# Altium schematic symbol library TI Amplifiers and Linear Special Function Amplifier.SchLib: 708 symbols (part 12 of 34)
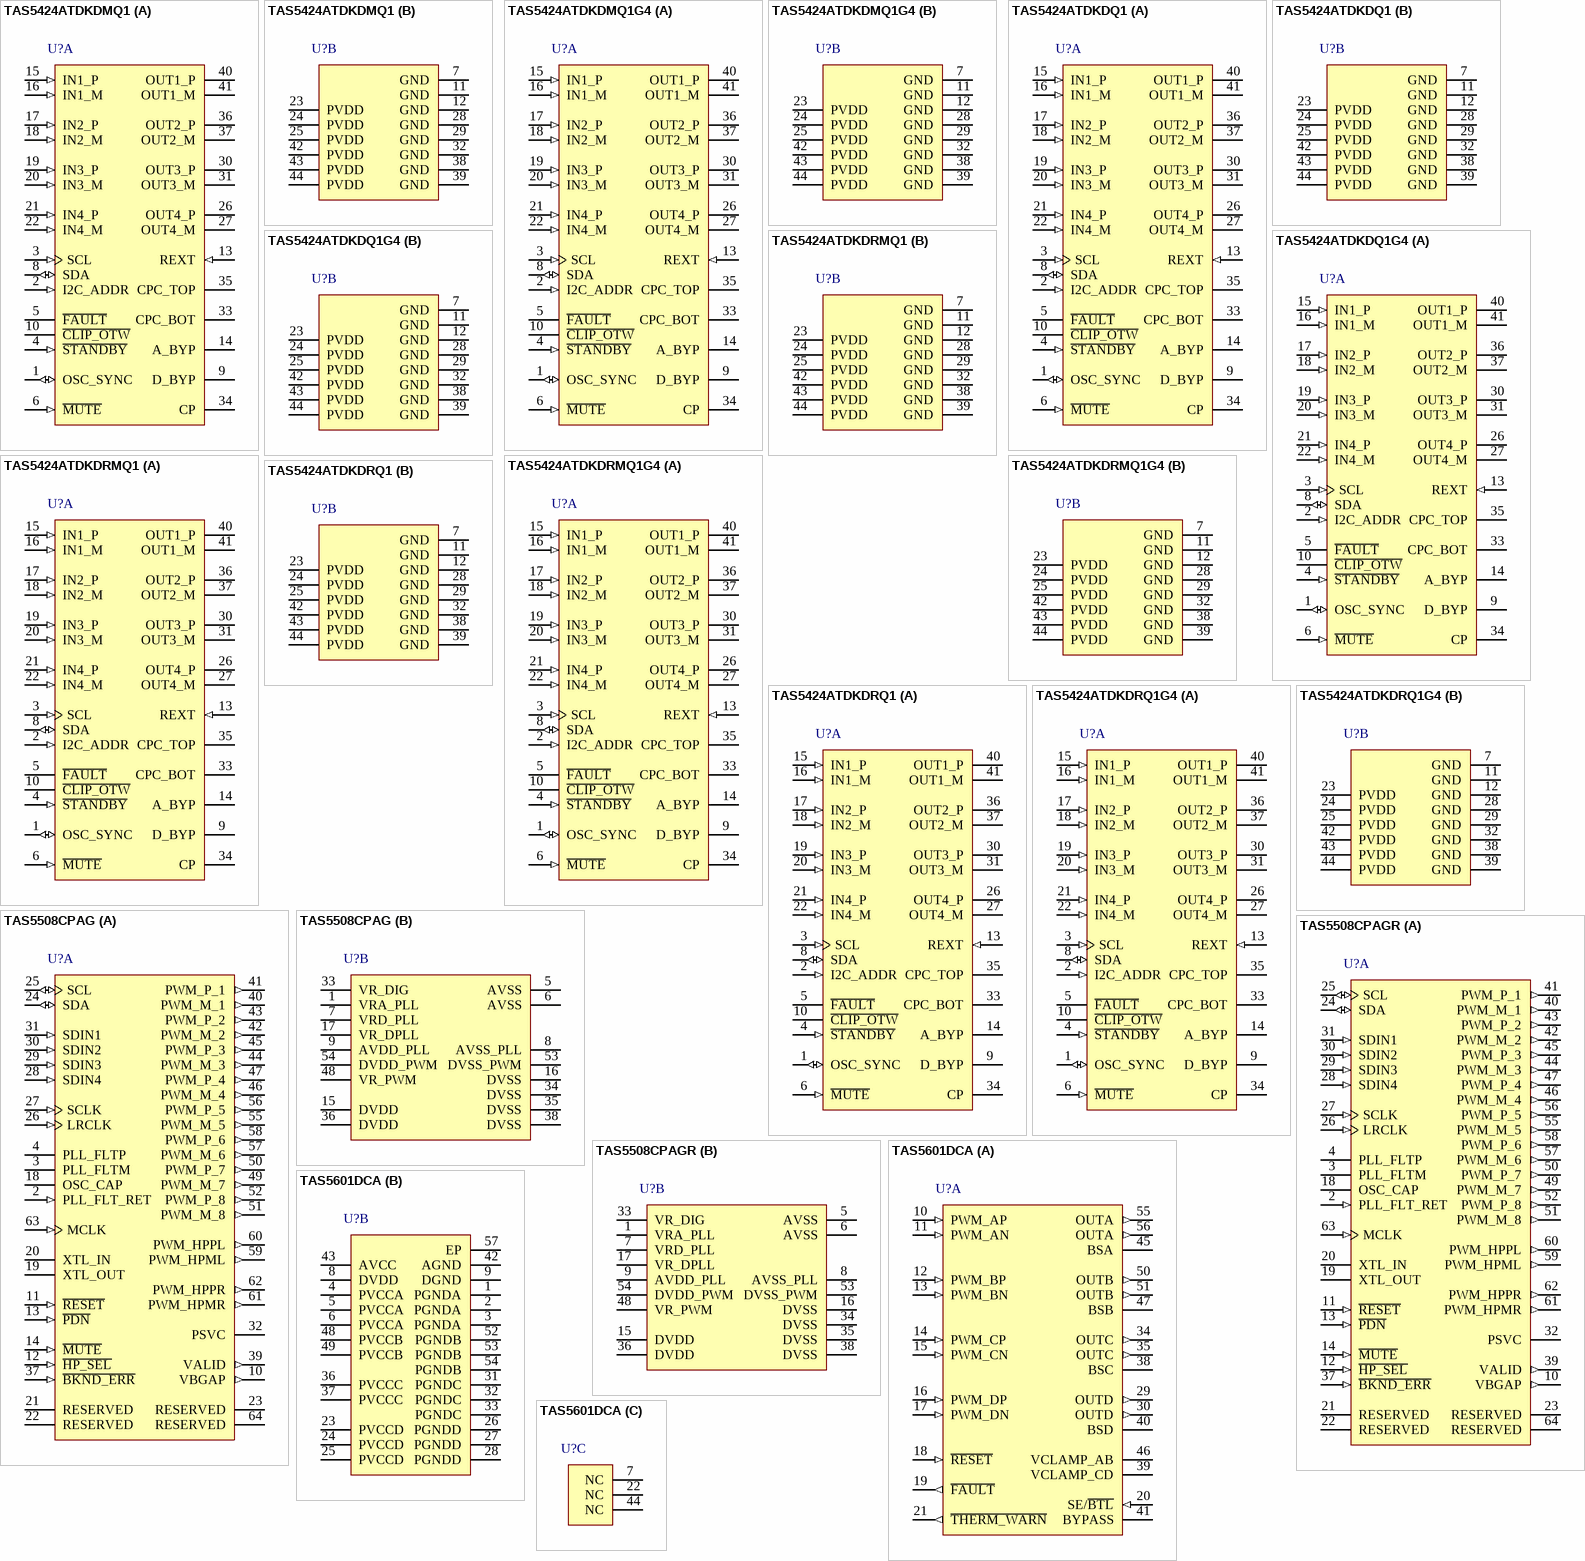
[diagram p50: symbols TAS5424ATDKDMQ1 to TAS5601DCA]

## TAS5424ATDKDMQ1G4
designator U?
4-Channel Automotive Digital Amplifier, -40 to 105 degC, 44-pin SOP (DKD44), Green (RoHS & no Sb/Br); Manufacturer: Texas Instruments; PartNumber: TAS5424ATDKDMQ1G4; Analog Supply Max [V]: 26.5; Analog Supply Min [V]: 6; Input Type: Analog; Max. Number of Speaker Outputs: 4; SubFamily: Mid/High-Power Amplifier; DatasheetVersion: SLOS535C; PackageVersion: 4204421-3/K, 06/2012; PackageReference: DKD44; PackageDescription: 44-Pin Plastic Small Outline, Body 11 x 15.9 mm, Pitch 0.65 mm; Supplier 1: Digi-Key; Supplier Part Number 1: TAS5424ATDKDMQ1G4-ND; Supplier 2: Mouser; Supplier Part Number 2: 595-TA5424ATDKDMQ1G4; Eco-Plan: Green (RoHS & no Sb/Br); Power Stage Supply Min(V): 6; Mounting Technology: Surface Mount; ComponentLink1Description: Manufacturer URL; ComponentLink1URL: http://www.ti.com/; ComponentLink2Description: Datasheet; ComponentLink2URL: http://www.ti.com/general/docs/lit/getliterature.tsp?genericPartNumber=TAS5424A&fileType=pdf; ComponentLink3Description: Package Specification; ComponentLink3URL: http://www.ti.com/litv/pdf/mpdi001b
footprint TI-DKD44_N (SOP, 44-Leads, Body 15.9x11mm, Pitch 0.65mm, IPC Medium Density)
footprint TI-DKD44_L (SOP, 44-Leads, Body 15.9x11mm, Pitch 0.65mm, IPC High Density)
footprint TI-DKD44_M (SOP, 44-Leads, Body 15.9x11mm, Pitch 0.65mm, IPC Low Density)
part A pins: 1 OSC_SYNC (io) "Oscillator sync input from master or output to slave amplifiers (20 MHz divided by 5, 6, or 7)", 2 I2C_ADDR (in) "I2C address bit", 3 SCL (in) "I2C clock input from system I2C master", 4 ~{STANDBY} (in) "Active-low STANDBY pin. Standby (low), power up (high)", 5 ~{FAULT} (oc) "Global fault output (open drain): UV, OV, OTSD, OCSD, DC", 6 ~{MUTE} (in) "Gain ramp control: mute (low), play (high)", 8 SDA (io) "I2C data I/O for communication with system I2C master", 9 D_BYP "Bypass pin for DVDD regulator output", 10 ~{CLIP_OTW} (oc) "Open-drain CLIP, OTW, or logical OR of the CLIP and OTW outputs. It also reports tweeter detection during tweeter mode.", 13 REXT (in) "Precision resistor pin to set analog reference", 14 A_BYP "Bypass pin for the AVDD analog regulator", 15 IN1_P (in) "Non-inverting analog input for channel 1", 16 IN1_M (in) "Inverting analog input for channel 1 (TAS5424A only)", 17 IN2_P (in) "Non-inverting analog input for channel 2", 18 IN2_M (in) "Inverting analog input for channel 2 (TAS5424A only)", 19 IN3_P (in) "Non-inverting analog input for channel 3", 20 IN3_M (in) "Inverting analog input for channel 3 (TAS5424A only)", 21 IN4_P (in) "Non-inverting analog input for channel 4", 22 IN4_M (in) "Inverting analog input for channel 4 (TAS5424A only)", 26 OUT4_P (hiz) "+ polarity output for bridge 4", 27 OUT4_M (hiz) "- polarity output for bridge 4", 30 OUT3_P (hiz) "+ polarity output for bridge 3", 31 OUT3_M (hiz) "- polarity output for bridge 3", 33 CPC_BOT "Bottom of flying capacitor for charge pump", 34 CP "Top of main storage capacitor for charge pump (bottom goes to PVDD)", 35 CPC_TOP "Top of flying capacitor for charge pump", 36 OUT2_P (hiz) "+ polarity output for bridge 2", 37 OUT2_M (hiz) "- polarity output for bridge 2", 40 OUT1_P (hiz) "+ polarity output for bridge 1", 41 OUT1_M (hiz) "- polarity output for bridge 1"
part B pins: 7 GND (power) "Ground", 11 GND (power) "Ground", 12 GND (power) "Ground", 23 PVDD (power) "PVDD supply", 24 PVDD (power) "PVDD supply", 25 PVDD (power) "PVDD supply", 28 GND (power) "Ground", 29 GND (power) "Ground", 32 GND (power) "Ground", 38 GND (power) "Ground", 39 GND (power) "Ground", 42 PVDD (power) "PVDD supply", 43 PVDD (power) "PVDD supply", 44 PVDD (power) "PVDD supply"

## TAS5424ATDKDQ1
designator U?
4-Channel Automotive Digital Amplifier, -40 to 105 degC, 44-pin SOP (DKD44), Green (RoHS & no Sb/Br); Manufacturer: Texas Instruments; PartNumber: TAS5424ATDKDQ1; Analog Supply Max [V]: 26.5; Analog Supply Min [V]: 6; Input Type: Analog; Max. Number of Speaker Outputs: 4; SubFamily: Mid/High-Power Amplifier; DatasheetVersion: SLOS535C; PackageVersion: 4204421-3/K, 06/2012; PackageReference: DKD44; PackageDescription: 44-Pin Plastic Small Outline, Body 11 x 15.9 mm, Pitch 0.65 mm; Supplier 1: Digi-Key; Supplier Part Number 1: TAS5424ATDKDQ1-ND; Supplier 2: Newark; Supplier Part Number 2: 54M7298; Supplier 3: Mouser; Supplier Part Number 3: 595-TAS5424ATDKDQ1; Eco-Plan: Green (RoHS & no Sb/Br); Power Stage Supply Min(V): 6; Mounting Technology: Surface Mount; ComponentLink1Description: Manufacturer URL; ComponentLink1URL: http://www.ti.com/; ComponentLink2Description: Datasheet; ComponentLink2URL: http://www.ti.com/general/docs/lit/getliterature.tsp?genericPartNumber=TAS5424A&fileType=pdf; ComponentLink3Description: Package Specification; ComponentLink3URL: http://www.ti.com/litv/pdf/mpdi001b
footprint TI-DKD44_N (SOP, 44-Leads, Body 15.9x11mm, Pitch 0.65mm, IPC Medium Density)
footprint TI-DKD44_L (SOP, 44-Leads, Body 15.9x11mm, Pitch 0.65mm, IPC High Density)
footprint TI-DKD44_M (SOP, 44-Leads, Body 15.9x11mm, Pitch 0.65mm, IPC Low Density)
part A pins: 1 OSC_SYNC (io) "Oscillator sync input from master or output to slave amplifiers (20 MHz divided by 5, 6, or 7)", 2 I2C_ADDR (in) "I2C address bit", 3 SCL (in) "I2C clock input from system I2C master", 4 ~{STANDBY} (in) "Active-low STANDBY pin. Standby (low), power up (high)", 5 ~{FAULT} (oc) "Global fault output (open drain): UV, OV, OTSD, OCSD, DC", 6 ~{MUTE} (in) "Gain ramp control: mute (low), play (high)", 8 SDA (io) "I2C data I/O for communication with system I2C master", 9 D_BYP "Bypass pin for DVDD regulator output", 10 ~{CLIP_OTW} (oc) "Open-drain CLIP, OTW, or logical OR of the CLIP and OTW outputs. It also reports tweeter detection during tweeter mode.", 13 REXT (in) "Precision resistor pin to set analog reference", 14 A_BYP "Bypass pin for the AVDD analog regulator", 15 IN1_P (in) "Non-inverting analog input for channel 1", 16 IN1_M (in) "Inverting analog input for channel 1 (TAS5424A only)", 17 IN2_P (in) "Non-inverting analog input for channel 2", 18 IN2_M (in) "Inverting analog input for channel 2 (TAS5424A only)", 19 IN3_P (in) "Non-inverting analog input for channel 3", 20 IN3_M (in) "Inverting analog input for channel 3 (TAS5424A only)", 21 IN4_P (in) "Non-inverting analog input for channel 4", 22 IN4_M (in) "Inverting analog input for channel 4 (TAS5424A only)", 26 OUT4_P (hiz) "+ polarity output for bridge 4", 27 OUT4_M (hiz) "- polarity output for bridge 4", 30 OUT3_P (hiz) "+ polarity output for bridge 3", 31 OUT3_M (hiz) "- polarity output for bridge 3", 33 CPC_BOT "Bottom of flying capacitor for charge pump", 34 CP "Top of main storage capacitor for charge pump (bottom goes to PVDD)", 35 CPC_TOP "Top of flying capacitor for charge pump", 36 OUT2_P (hiz) "+ polarity output for bridge 2", 37 OUT2_M (hiz) "- polarity output for bridge 2", 40 OUT1_P (hiz) "+ polarity output for bridge 1", 41 OUT1_M (hiz) "- polarity output for bridge 1"
part B pins: 7 GND (power) "Ground", 11 GND (power) "Ground", 12 GND (power) "Ground", 23 PVDD (power) "PVDD supply", 24 PVDD (power) "PVDD supply", 25 PVDD (power) "PVDD supply", 28 GND (power) "Ground", 29 GND (power) "Ground", 32 GND (power) "Ground", 38 GND (power) "Ground", 39 GND (power) "Ground", 42 PVDD (power) "PVDD supply", 43 PVDD (power) "PVDD supply", 44 PVDD (power) "PVDD supply"

## TAS5424ATDKDQ1G4
designator U?
4-Channel Automotive Digital Amplifier, -40 to 105 degC, 44-pin SOP (DKD44), Green (RoHS & no Sb/Br); Manufacturer: Texas Instruments; PartNumber: TAS5424ATDKDQ1G4; Analog Supply Max [V]: 26.5; Analog Supply Min [V]: 6; Input Type: Analog; Max. Number of Speaker Outputs: 4; SubFamily: Mid/High-Power Amplifier; DatasheetVersion: SLOS535C; PackageVersion: 4204421-3/K, 06/2012; PackageReference: DKD44; PackageDescription: 44-Pin Plastic Small Outline, Body 11 x 15.9 mm, Pitch 0.65 mm; Supplier 1: Digi-Key; Supplier Part Number 1: TAS5424ATDKDQ1G4-ND; Supplier 2: Mouser; Supplier Part Number 2: 595-TAS5424ATDKDQ1G4; Eco-Plan: Green (RoHS & no Sb/Br); Power Stage Supply Min(V): 6; Mounting Technology: Surface Mount; ComponentLink1Description: Manufacturer URL; ComponentLink1URL: http://www.ti.com/; ComponentLink2Description: Datasheet; ComponentLink2URL: http://www.ti.com/general/docs/lit/getliterature.tsp?genericPartNumber=TAS5424A&fileType=pdf; ComponentLink3Description: Package Specification; ComponentLink3URL: http://www.ti.com/litv/pdf/mpdi001b
footprint TI-DKD44_N (SOP, 44-Leads, Body 15.9x11mm, Pitch 0.65mm, IPC Medium Density)
footprint TI-DKD44_L (SOP, 44-Leads, Body 15.9x11mm, Pitch 0.65mm, IPC High Density)
footprint TI-DKD44_M (SOP, 44-Leads, Body 15.9x11mm, Pitch 0.65mm, IPC Low Density)
part A pins: 1 OSC_SYNC (io) "Oscillator sync input from master or output to slave amplifiers (20 MHz divided by 5, 6, or 7)", 2 I2C_ADDR (in) "I2C address bit", 3 SCL (in) "I2C clock input from system I2C master", 4 ~{STANDBY} (in) "Active-low STANDBY pin. Standby (low), power up (high)", 5 ~{FAULT} (oc) "Global fault output (open drain): UV, OV, OTSD, OCSD, DC", 6 ~{MUTE} (in) "Gain ramp control: mute (low), play (high)", 8 SDA (io) "I2C data I/O for communication with system I2C master", 9 D_BYP "Bypass pin for DVDD regulator output", 10 ~{CLIP_OTW} (oc) "Open-drain CLIP, OTW, or logical OR of the CLIP and OTW outputs. It also reports tweeter detection during tweeter mode.", 13 REXT (in) "Precision resistor pin to set analog reference", 14 A_BYP "Bypass pin for the AVDD analog regulator", 15 IN1_P (in) "Non-inverting analog input for channel 1", 16 IN1_M (in) "Inverting analog input for channel 1 (TAS5424A only)", 17 IN2_P (in) "Non-inverting analog input for channel 2", 18 IN2_M (in) "Inverting analog input for channel 2 (TAS5424A only)", 19 IN3_P (in) "Non-inverting analog input for channel 3", 20 IN3_M (in) "Inverting analog input for channel 3 (TAS5424A only)", 21 IN4_P (in) "Non-inverting analog input for channel 4", 22 IN4_M (in) "Inverting analog input for channel 4 (TAS5424A only)", 26 OUT4_P (hiz) "+ polarity output for bridge 4", 27 OUT4_M (hiz) "- polarity output for bridge 4", 30 OUT3_P (hiz) "+ polarity output for bridge 3", 31 OUT3_M (hiz) "- polarity output for bridge 3", 33 CPC_BOT "Bottom of flying capacitor for charge pump", 34 CP "Top of main storage capacitor for charge pump (bottom goes to PVDD)", 35 CPC_TOP "Top of flying capacitor for charge pump", 36 OUT2_P (hiz) "+ polarity output for bridge 2", 37 OUT2_M (hiz) "- polarity output for bridge 2", 40 OUT1_P (hiz) "+ polarity output for bridge 1", 41 OUT1_M (hiz) "- polarity output for bridge 1"
part B pins: 7 GND (power) "Ground", 11 GND (power) "Ground", 12 GND (power) "Ground", 23 PVDD (power) "PVDD supply", 24 PVDD (power) "PVDD supply", 25 PVDD (power) "PVDD supply", 28 GND (power) "Ground", 29 GND (power) "Ground", 32 GND (power) "Ground", 38 GND (power) "Ground", 39 GND (power) "Ground", 42 PVDD (power) "PVDD supply", 43 PVDD (power) "PVDD supply", 44 PVDD (power) "PVDD supply"

## TAS5424ATDKDRMQ1
designator U?
4-Channel Automotive Digital Amplifier, -40 to 105 degC, 44-pin SOP (DKD44), Green (RoHS & no Sb/Br); Manufacturer: Texas Instruments; PartNumber: TAS5424ATDKDRMQ1; Analog Supply Max [V]: 26.5; Analog Supply Min [V]: 6; Input Type: Analog; Max. Number of Speaker Outputs: 4; SubFamily: Mid/High-Power Amplifier; DatasheetVersion: SLOS535C; PackageVersion: 4204421-3/K, 06/2012; PackageReference: DKD44; PackageDescription: 44-Pin Plastic Small Outline, Body 11 x 15.9 mm, Pitch 0.65 mm; Supplier 1: Digi-Key; Supplier Part Number 1: TAS5424ATDKDRMQ1-ND; Supplier 2: Mouser; Supplier Part Number 2: 595-TAS5424ATDKDRMQ1; Eco-Plan: Green (RoHS & no Sb/Br); Power Stage Supply Min(V): 6; Mounting Technology: Surface Mount; ComponentLink1Description: Manufacturer URL; ComponentLink1URL: http://www.ti.com/; ComponentLink2Description: Datasheet; ComponentLink2URL: http://www.ti.com/general/docs/lit/getliterature.tsp?genericPartNumber=TAS5424A&fileType=pdf; ComponentLink3Description: Package Specification; ComponentLink3URL: http://www.ti.com/litv/pdf/mpdi001b
footprint TI-DKD44_N (SOP, 44-Leads, Body 15.9x11mm, Pitch 0.65mm, IPC Medium Density)
footprint TI-DKD44_L (SOP, 44-Leads, Body 15.9x11mm, Pitch 0.65mm, IPC High Density)
footprint TI-DKD44_M (SOP, 44-Leads, Body 15.9x11mm, Pitch 0.65mm, IPC Low Density)
part A pins: 1 OSC_SYNC (io) "Oscillator sync input from master or output to slave amplifiers (20 MHz divided by 5, 6, or 7)", 2 I2C_ADDR (in) "I2C address bit", 3 SCL (in) "I2C clock input from system I2C master", 4 ~{STANDBY} (in) "Active-low STANDBY pin. Standby (low), power up (high)", 5 ~{FAULT} (oc) "Global fault output (open drain): UV, OV, OTSD, OCSD, DC", 6 ~{MUTE} (in) "Gain ramp control: mute (low), play (high)", 8 SDA (io) "I2C data I/O for communication with system I2C master", 9 D_BYP "Bypass pin for DVDD regulator output", 10 ~{CLIP_OTW} (oc) "Open-drain CLIP, OTW, or logical OR of the CLIP and OTW outputs. It also reports tweeter detection during tweeter mode.", 13 REXT (in) "Precision resistor pin to set analog reference", 14 A_BYP "Bypass pin for the AVDD analog regulator", 15 IN1_P (in) "Non-inverting analog input for channel 1", 16 IN1_M (in) "Inverting analog input for channel 1 (TAS5424A only)", 17 IN2_P (in) "Non-inverting analog input for channel 2", 18 IN2_M (in) "Inverting analog input for channel 2 (TAS5424A only)", 19 IN3_P (in) "Non-inverting analog input for channel 3", 20 IN3_M (in) "Inverting analog input for channel 3 (TAS5424A only)", 21 IN4_P (in) "Non-inverting analog input for channel 4", 22 IN4_M (in) "Inverting analog input for channel 4 (TAS5424A only)", 26 OUT4_P (hiz) "+ polarity output for bridge 4", 27 OUT4_M (hiz) "- polarity output for bridge 4", 30 OUT3_P (hiz) "+ polarity output for bridge 3", 31 OUT3_M (hiz) "- polarity output for bridge 3", 33 CPC_BOT "Bottom of flying capacitor for charge pump", 34 CP "Top of main storage capacitor for charge pump (bottom goes to PVDD)", 35 CPC_TOP "Top of flying capacitor for charge pump", 36 OUT2_P (hiz) "+ polarity output for bridge 2", 37 OUT2_M (hiz) "- polarity output for bridge 2", 40 OUT1_P (hiz) "+ polarity output for bridge 1", 41 OUT1_M (hiz) "- polarity output for bridge 1"
part B pins: 7 GND (power) "Ground", 11 GND (power) "Ground", 12 GND (power) "Ground", 23 PVDD (power) "PVDD supply", 24 PVDD (power) "PVDD supply", 25 PVDD (power) "PVDD supply", 28 GND (power) "Ground", 29 GND (power) "Ground", 32 GND (power) "Ground", 38 GND (power) "Ground", 39 GND (power) "Ground", 42 PVDD (power) "PVDD supply", 43 PVDD (power) "PVDD supply", 44 PVDD (power) "PVDD supply"

## TAS5424ATDKDRMQ1G4
designator U?
4-Channel Automotive Digital Amplifier, -40 to 105 degC, 44-pin SOP (DKD44), Green (RoHS & no Sb/Br); Manufacturer: Texas Instruments; PartNumber: TAS5424ATDKDRMQ1G4; Analog Supply Max [V]: 26.5; Analog Supply Min [V]: 6; Input Type: Analog; Max. Number of Speaker Outputs: 4; SubFamily: Mid/High-Power Amplifier; DatasheetVersion: SLOS535C; PackageVersion: 4204421-3/K, 06/2012; PackageReference: DKD44; PackageDescription: 44-Pin Plastic Small Outline, Body 11 x 15.9 mm, Pitch 0.65 mm; Supplier 1: Digi-Key; Supplier Part Number 1: TAS5424ATDKDRMQ1G4-ND; Supplier 2: Mouser; Supplier Part Number 2: 595-T5424ATDKDRMQ1G4; Eco-Plan: Green (RoHS & no Sb/Br); Power Stage Supply Min(V): 6; Mounting Technology: Surface Mount; ComponentLink1Description: Manufacturer URL; ComponentLink1URL: http://www.ti.com/; ComponentLink2Description: Datasheet; ComponentLink2URL: http://www.ti.com/general/docs/lit/getliterature.tsp?genericPartNumber=TAS5424A&fileType=pdf; ComponentLink3Description: Package Specification; ComponentLink3URL: http://www.ti.com/litv/pdf/mpdi001b
footprint TI-DKD44_N (SOP, 44-Leads, Body 15.9x11mm, Pitch 0.65mm, IPC Medium Density)
footprint TI-DKD44_L (SOP, 44-Leads, Body 15.9x11mm, Pitch 0.65mm, IPC High Density)
footprint TI-DKD44_M (SOP, 44-Leads, Body 15.9x11mm, Pitch 0.65mm, IPC Low Density)
part A pins: 1 OSC_SYNC (io) "Oscillator sync input from master or output to slave amplifiers (20 MHz divided by 5, 6, or 7)", 2 I2C_ADDR (in) "I2C address bit", 3 SCL (in) "I2C clock input from system I2C master", 4 ~{STANDBY} (in) "Active-low STANDBY pin. Standby (low), power up (high)", 5 ~{FAULT} (oc) "Global fault output (open drain): UV, OV, OTSD, OCSD, DC", 6 ~{MUTE} (in) "Gain ramp control: mute (low), play (high)", 8 SDA (io) "I2C data I/O for communication with system I2C master", 9 D_BYP "Bypass pin for DVDD regulator output", 10 ~{CLIP_OTW} (oc) "Open-drain CLIP, OTW, or logical OR of the CLIP and OTW outputs. It also reports tweeter detection during tweeter mode.", 13 REXT (in) "Precision resistor pin to set analog reference", 14 A_BYP "Bypass pin for the AVDD analog regulator", 15 IN1_P (in) "Non-inverting analog input for channel 1", 16 IN1_M (in) "Inverting analog input for channel 1 (TAS5424A only)", 17 IN2_P (in) "Non-inverting analog input for channel 2", 18 IN2_M (in) "Inverting analog input for channel 2 (TAS5424A only)", 19 IN3_P (in) "Non-inverting analog input for channel 3", 20 IN3_M (in) "Inverting analog input for channel 3 (TAS5424A only)", 21 IN4_P (in) "Non-inverting analog input for channel 4", 22 IN4_M (in) "Inverting analog input for channel 4 (TAS5424A only)", 26 OUT4_P (hiz) "+ polarity output for bridge 4", 27 OUT4_M (hiz) "- polarity output for bridge 4", 30 OUT3_P (hiz) "+ polarity output for bridge 3", 31 OUT3_M (hiz) "- polarity output for bridge 3", 33 CPC_BOT "Bottom of flying capacitor for charge pump", 34 CP "Top of main storage capacitor for charge pump (bottom goes to PVDD)", 35 CPC_TOP "Top of flying capacitor for charge pump", 36 OUT2_P (hiz) "+ polarity output for bridge 2", 37 OUT2_M (hiz) "- polarity output for bridge 2", 40 OUT1_P (hiz) "+ polarity output for bridge 1", 41 OUT1_M (hiz) "- polarity output for bridge 1"
part B pins: 7 GND (power) "Ground", 11 GND (power) "Ground", 12 GND (power) "Ground", 23 PVDD (power) "PVDD supply", 24 PVDD (power) "PVDD supply", 25 PVDD (power) "PVDD supply", 28 GND (power) "Ground", 29 GND (power) "Ground", 32 GND (power) "Ground", 38 GND (power) "Ground", 39 GND (power) "Ground", 42 PVDD (power) "PVDD supply", 43 PVDD (power) "PVDD supply", 44 PVDD (power) "PVDD supply"

## TAS5424ATDKDRQ1
designator U?
4-Channel Automotive Digital Amplifier, -40 to 105 degC, 44-pin SOP (DKD44), Green (RoHS & no Sb/Br); Manufacturer: Texas Instruments; PartNumber: TAS5424ATDKDRQ1; Analog Supply Max [V]: 26.5; Analog Supply Min [V]: 6; Input Type: Analog; Max. Number of Speaker Outputs: 4; SubFamily: Mid/High-Power Amplifier; DatasheetVersion: SLOS535C; PackageVersion: 4204421-3/K, 06/2012; PackageReference: DKD44; PackageDescription: 44-Pin Plastic Small Outline, Body 11 x 15.9 mm, Pitch 0.65 mm; Supplier 1: Digi-Key; Supplier Part Number 1: 296-22067-2-ND; Supplier 2: Digi-Key; Supplier Part Number 2: 296-22067-1-ND; Supplier 3: Mouser; Supplier Part Number 3: 595-TAS5424ATDKDRQ1; Eco-Plan: Green (RoHS & no Sb/Br); Power Stage Supply Min(V): 6; Mounting Technology: Surface Mount; ComponentLink1Description: Manufacturer URL; ComponentLink1URL: http://www.ti.com/; ComponentLink2Description: Datasheet; ComponentLink2URL: http://www.ti.com/general/docs/lit/getliterature.tsp?genericPartNumber=TAS5424A&fileType=pdf; ComponentLink3Description: Package Specification; ComponentLink3URL: http://www.ti.com/litv/pdf/mpdi001b
footprint TI-DKD44_N (SOP, 44-Leads, Body 15.9x11mm, Pitch 0.65mm, IPC Medium Density)
footprint TI-DKD44_L (SOP, 44-Leads, Body 15.9x11mm, Pitch 0.65mm, IPC High Density)
footprint TI-DKD44_M (SOP, 44-Leads, Body 15.9x11mm, Pitch 0.65mm, IPC Low Density)
part A pins: 1 OSC_SYNC (io) "Oscillator sync input from master or output to slave amplifiers (20 MHz divided by 5, 6, or 7)", 2 I2C_ADDR (in) "I2C address bit", 3 SCL (in) "I2C clock input from system I2C master", 4 ~{STANDBY} (in) "Active-low STANDBY pin. Standby (low), power up (high)", 5 ~{FAULT} (oc) "Global fault output (open drain): UV, OV, OTSD, OCSD, DC", 6 ~{MUTE} (in) "Gain ramp control: mute (low), play (high)", 8 SDA (io) "I2C data I/O for communication with system I2C master", 9 D_BYP "Bypass pin for DVDD regulator output", 10 ~{CLIP_OTW} (oc) "Open-drain CLIP, OTW, or logical OR of the CLIP and OTW outputs. It also reports tweeter detection during tweeter mode.", 13 REXT (in) "Precision resistor pin to set analog reference", 14 A_BYP "Bypass pin for the AVDD analog regulator", 15 IN1_P (in) "Non-inverting analog input for channel 1", 16 IN1_M (in) "Inverting analog input for channel 1 (TAS5424A only)", 17 IN2_P (in) "Non-inverting analog input for channel 2", 18 IN2_M (in) "Inverting analog input for channel 2 (TAS5424A only)", 19 IN3_P (in) "Non-inverting analog input for channel 3", 20 IN3_M (in) "Inverting analog input for channel 3 (TAS5424A only)", 21 IN4_P (in) "Non-inverting analog input for channel 4", 22 IN4_M (in) "Inverting analog input for channel 4 (TAS5424A only)", 26 OUT4_P (hiz) "+ polarity output for bridge 4", 27 OUT4_M (hiz) "- polarity output for bridge 4", 30 OUT3_P (hiz) "+ polarity output for bridge 3", 31 OUT3_M (hiz) "- polarity output for bridge 3", 33 CPC_BOT "Bottom of flying capacitor for charge pump", 34 CP "Top of main storage capacitor for charge pump (bottom goes to PVDD)", 35 CPC_TOP "Top of flying capacitor for charge pump", 36 OUT2_P (hiz) "+ polarity output for bridge 2", 37 OUT2_M (hiz) "- polarity output for bridge 2", 40 OUT1_P (hiz) "+ polarity output for bridge 1", 41 OUT1_M (hiz) "- polarity output for bridge 1"
part B pins: 7 GND (power) "Ground", 11 GND (power) "Ground", 12 GND (power) "Ground", 23 PVDD (power) "PVDD supply", 24 PVDD (power) "PVDD supply", 25 PVDD (power) "PVDD supply", 28 GND (power) "Ground", 29 GND (power) "Ground", 32 GND (power) "Ground", 38 GND (power) "Ground", 39 GND (power) "Ground", 42 PVDD (power) "PVDD supply", 43 PVDD (power) "PVDD supply", 44 PVDD (power) "PVDD supply"

## TAS5424ATDKDRQ1G4
designator U?
4-Channel Automotive Digital Amplifier, -40 to 105 degC, 44-pin SOP (DKD44), Green (RoHS & no Sb/Br); Manufacturer: Texas Instruments; PartNumber: TAS5424ATDKDRQ1G4; Analog Supply Max [V]: 26.5; Analog Supply Min [V]: 6; Input Type: Analog; Max. Number of Speaker Outputs: 4; SubFamily: Mid/High-Power Amplifier; DatasheetVersion: SLOS535C; PackageVersion: 4204421-3/K, 06/2012; PackageReference: DKD44; PackageDescription: 44-Pin Plastic Small Outline, Body 11 x 15.9 mm, Pitch 0.65 mm; Supplier 1: Digi-Key; Supplier Part Number 1: TAS5424ATDKDRQ1G4-ND; Supplier 2: Mouser; Supplier Part Number 2: 595-TA5424ATDKDRQ1G4; Eco-Plan: Green (RoHS & no Sb/Br); Power Stage Supply Min(V): 6; Mounting Technology: Surface Mount; ComponentLink1Description: Manufacturer URL; ComponentLink1URL: http://www.ti.com/; ComponentLink2Description: Datasheet; ComponentLink2URL: http://www.ti.com/general/docs/lit/getliterature.tsp?genericPartNumber=TAS5424A&fileType=pdf; ComponentLink3Description: Package Specification; ComponentLink3URL: http://www.ti.com/litv/pdf/mpdi001b
footprint TI-DKD44_N (SOP, 44-Leads, Body 15.9x11mm, Pitch 0.65mm, IPC Medium Density)
footprint TI-DKD44_L (SOP, 44-Leads, Body 15.9x11mm, Pitch 0.65mm, IPC High Density)
footprint TI-DKD44_M (SOP, 44-Leads, Body 15.9x11mm, Pitch 0.65mm, IPC Low Density)
part A pins: 1 OSC_SYNC (io) "Oscillator sync input from master or output to slave amplifiers (20 MHz divided by 5, 6, or 7)", 2 I2C_ADDR (in) "I2C address bit", 3 SCL (in) "I2C clock input from system I2C master", 4 ~{STANDBY} (in) "Active-low STANDBY pin. Standby (low), power up (high)", 5 ~{FAULT} (oc) "Global fault output (open drain): UV, OV, OTSD, OCSD, DC", 6 ~{MUTE} (in) "Gain ramp control: mute (low), play (high)", 8 SDA (io) "I2C data I/O for communication with system I2C master", 9 D_BYP "Bypass pin for DVDD regulator output", 10 ~{CLIP_OTW} (oc) "Open-drain CLIP, OTW, or logical OR of the CLIP and OTW outputs. It also reports tweeter detection during tweeter mode.", 13 REXT (in) "Precision resistor pin to set analog reference", 14 A_BYP "Bypass pin for the AVDD analog regulator", 15 IN1_P (in) "Non-inverting analog input for channel 1", 16 IN1_M (in) "Inverting analog input for channel 1 (TAS5424A only)", 17 IN2_P (in) "Non-inverting analog input for channel 2", 18 IN2_M (in) "Inverting analog input for channel 2 (TAS5424A only)", 19 IN3_P (in) "Non-inverting analog input for channel 3", 20 IN3_M (in) "Inverting analog input for channel 3 (TAS5424A only)", 21 IN4_P (in) "Non-inverting analog input for channel 4", 22 IN4_M (in) "Inverting analog input for channel 4 (TAS5424A only)", 26 OUT4_P (hiz) "+ polarity output for bridge 4", 27 OUT4_M (hiz) "- polarity output for bridge 4", 30 OUT3_P (hiz) "+ polarity output for bridge 3", 31 OUT3_M (hiz) "- polarity output for bridge 3", 33 CPC_BOT "Bottom of flying capacitor for charge pump", 34 CP "Top of main storage capacitor for charge pump (bottom goes to PVDD)", 35 CPC_TOP "Top of flying capacitor for charge pump", 36 OUT2_P (hiz) "+ polarity output for bridge 2", 37 OUT2_M (hiz) "- polarity output for bridge 2", 40 OUT1_P (hiz) "+ polarity output for bridge 1", 41 OUT1_M (hiz) "- polarity output for bridge 1"
part B pins: 7 GND (power) "Ground", 11 GND (power) "Ground", 12 GND (power) "Ground", 23 PVDD (power) "PVDD supply", 24 PVDD (power) "PVDD supply", 25 PVDD (power) "PVDD supply", 28 GND (power) "Ground", 29 GND (power) "Ground", 32 GND (power) "Ground", 38 GND (power) "Ground", 39 GND (power) "Ground", 42 PVDD (power) "PVDD supply", 43 PVDD (power) "PVDD supply", 44 PVDD (power) "PVDD supply"
